# Altium integrated library Altium_WE-RJ45_LAN (rev21a).IntLib: 96 symbols
Pins are listed as number, name and electrical type; pins without a type are passive.

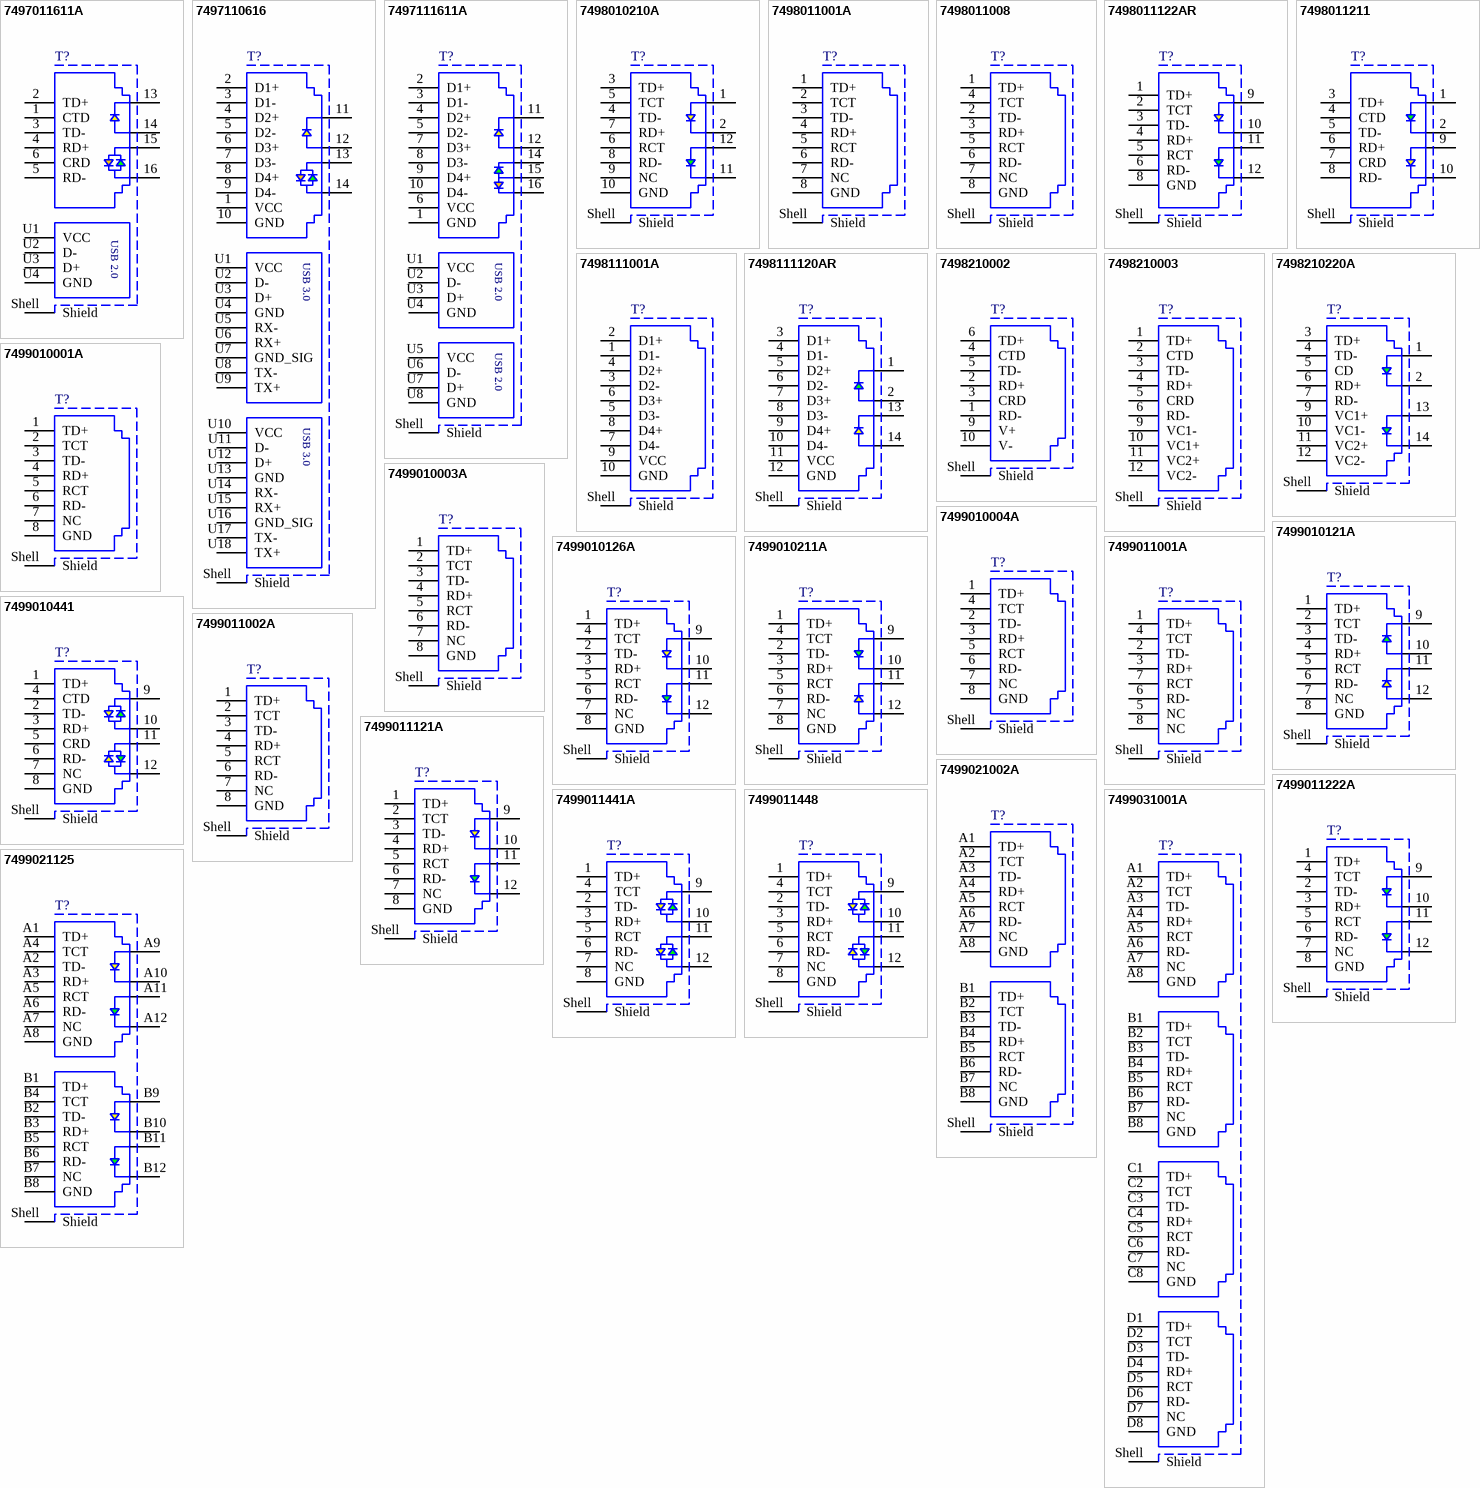
[diagram p0: symbols 7497011611A to 7499031001A]

## 7497011611A
designator T?
WE-RJ45 LAN Transformer, THT, 10/100 Base-T, Port 1x1, Tab Up; Manufacturer Part Number: 7497011611A; Manufacturer: Wurth Elektronik; PoE: non-PoE; LED: green/orange-yellow; USB: USB 2.0; Shield Tabs: Yes; HPLE: No; ComponentLink1Description: Manufacturer; ComponentLink1URL: http://www.we-online.de; ComponentLink2Description: Datasheet; ComponentLink2URL: https://www.we-online.com/catalog/datasheet/7497011611A.pdf; Published Date: October 2020; Tab: Up; Port Number: 1x1; Data Rate: 10/100 Base-T; Operating Temperature: -40 to +85degC; Mounting Technology: THT; Packaging: Tape and Reel
footprint 7497011611A
pins: 1 CTD, 2 TD+, 3 TD-, 4 RD+, 5 RD-, 6 CRD, 13, 14, 15, 16, Shell Shield, U1 VCC, U2 D-, U3 D+, U4 GND

## 7497110616
designator T?
WE-RJ45 LAN Transformer, THT, 10/100/1000 Base-T, Port 1x1, Tab Up; Manufacturer Part Number: 7497110616; Manufacturer: Wurth Elektronik; PoE: non-PoE; LED: yellow-green/orange; USB: 2xUSB 3.0; Shield Tabs: No; ComponentLink1Description: Manufacturer; ComponentLink1URL: http://www.we-online.de; ComponentLink2Description: Datasheet; ComponentLink2URL: https://www.we-online.com/catalog/datasheet/7497110616.pdf; Published Date: October 2020; Tab: Up; Port Number: 1x1; Data Rate: 10/100/1000 Base-T; Operating Temperature: -40 to +85degC; Mounting Technology: THT; Packaging: Tray; HPLE: No
footprint 7497110616
pins: 1 VCC, 2 D1+, 3 D1-, 4 D2+, 5 D2-, 6 D3+, 7 D3-, 8 D4+, 9 D4-, 10 GND, 11, 12, 13, 14, Shell Shield, U1 VCC, U2 D-, U3 D+, U4 GND, U5 RX-, U6 RX+, U7 GND_SIG, U8 TX-, U9 TX+, U10 VCC, U11 D-, U12 D+, U13 GND, U14 RX-, U15 RX+, U16 GND_SIG, U17 TX-, U18 TX+
text: USB 3.0

## 7497111611A
designator T?
WE-RJ45 LAN Transformer, THT, 10/100/1000 Base-T, Port 1x1, Tab Up; Manufacturer Part Number: 7497111611A; Manufacturer: Wurth Elektronik; PoE: non-PoE; LED: green/orange-yellow; USB: USB 2.0; Shield Tabs: Yes; HPLE: No; ComponentLink1Description: Manufacturer; ComponentLink1URL: http://www.we-online.de; ComponentLink2Description: Datasheet; ComponentLink2URL: https://www.we-online.com/catalog/datasheet/7497111611A.pdf; Published Date: October 2020; Tab: Up; Port Number: 1x1; Data Rate: 10/100/1000 Base-T; Operating Temperature: 0 to +70degC; Mounting Technology: THT; Packaging: Tube
footprint 7497111611A
pins: 1 GND, 2 D1+, 3 D1-, 4 D2+, 5 D2-, 6 VCC, 7 D3+, 8 D3-, 9 D4+, 10 D4-, 11, 12, 14, 15, 16, Shell Shield, U1 VCC, U2 D-, U3 D+, U4 GND, U5 VCC, U6 D-, U7 D+, U8 GND

## 7498010210A
designator T?
WE-RJ45 LAN Transformer, SMT, 10/100 Base-T, Port 1x1, Tab Up; Manufacturer Part Number: 7498010210A; Manufacturer: Wurth Elektronik; PoE: non-PoE; LED: green-yellow; USB: No; Shield Tabs: Yes; ComponentLink1Description: Manufacturer; ComponentLink1URL: http://www.we-online.de; ComponentLink2Description: Datasheet; ComponentLink2URL: https://www.we-online.com/catalog/datasheet/7498010210A.pdf; Published Date: October 2020; Tab: Up; Port Number: 1x1; Data Rate: 10/100 Base-T; Operating Temperature: -40 to +85degC; Mounting Technology: SMT; Packaging: Tape and Reel; HPLE: No
footprint 7498010210A (LAN Transformer, body 16.1x25.4mm)
pins: 1, 2, 3 TD+, 4 TD-, 5 TCT, 6 RCT, 7 RD+, 8 RD-, 9 NC, 10 GND, 11, 12, Shell Shield

## 7498011001A
designator T?
WE-RJ45 LAN Transformer, SMT, 10/100 Base-T, Port 1x1, Tab Down; Manufacturer Part Number: 7498011001A; Manufacturer: Wurth Elektronik; PoE: non-PoE; LED: No; Shield Tabs: Yes; ComponentLink1Description: Manufacturer; ComponentLink1URL: http://www.we-online.de; ComponentLink2Description: Datasheet; ComponentLink2URL: https://www.we-online.com/catalog/datasheet/7498011001A.pdf; Published Date: October 2020; Tab: Down; Port Number: 1x1; Data Rate: 10/100 Base-T; Operating Temperature: 0 to +70degC; USB: No; Mounting Technology: SMT; Packaging: Tray; HPLE: No
footprint 7498011001A
pins: 1 TD+, 2 TCT, 3 TD-, 4 RD+, 5 RCT, 6 RD-, 7 NC, 8 GND, Shell Shield

## 7498011008
designator T?
WE-RJ45 LAN Transformer, SMT, 10/100 Base-T, Port 1x1, Tab Down; Manufacturer Part Number: 7498011008; Manufacturer: Wurth Elektronik; PoE: non-PoE; LED: No; Shield Tabs: Yes; ComponentLink1Description: Manufacturer; ComponentLink1URL: http://www.we-online.de; ComponentLink2Description: Datasheet; ComponentLink2URL: https://www.we-online.com/catalog/datasheet/7498011008.pdf; Published Date: October 2020; Tab: Down; Port Number: 1x1; Data Rate: 10/100 Base-T; Operating Temperature: -40 to +85degC; USB: No; Mounting Technology: SMT; Packaging: Tray; HPLE: No
footprint 7498011008
pins: 1 TD+, 2 TD-, 3 RD+, 4 TCT, 5 RCT, 6 RD-, 7 NC, 8 GND, Shell Shield

## 7498011122AR
designator T?
WE-RJ45 LAN Transformer, SMT, 10/100 Base-T, Port 1x1, Tab Up; Manufacturer Part Number: 7498011122AR; Manufacturer: Wurth Elektronik; PoE: non-PoE; LED: yellow-green; USB: No; Shield Tabs: Yes; ComponentLink1Description: Manufacturer; ComponentLink1URL: http://www.we-online.de; ComponentLink2Description: Datasheet; ComponentLink2URL: https://www.we-online.com/catalog/datasheet/7498011122AR.pdf; Published Date: October 2020; Tab: Up; Port Number: 1x1; Data Rate: 10/100 Base-T; Operating Temperature: -40 to +85degC; Mounting Technology: SMT; Packaging: Tape and Reel; HPLE: No
footprint 7498011122AR
pins: 1 TD+, 2 TCT, 3 TD-, 4 RD+, 5 RCT, 6 RD-, 8 GND, 9, 10, 11, 12, Shell Shield

## 7498011211
designator T?
WE-RJ45 LAN Transformer, SMT, 10/100 Base-T, Port 1x1, Tab Down; Manufacturer Part Number: 7498011211; Manufacturer: Wurth Elektronik; PoE: non-PoE; LED: green-yellow; USB: No; Shield Tabs: Yes; ComponentLink1Description: Manufacturer; ComponentLink1URL: http://www.we-online.de; ComponentLink2Description: Datasheet; ComponentLink2URL: https://www.we-online.com/catalog/datasheet/7498011211.pdf; Published Date: October 2020; Tab: Down; Port Number: 1x1; Data Rate: 10/100 Base-T; Operating Temperature: 0 to +70degC; Mounting Technology: SMT; Packaging: Tray; HPLE: Yes
footprint 7498011211
pins: 1, 2, 3 TD+, 4 CTD, 5 TD-, 6 RD+, 7 CRD, 8 RD-, 9, 10, Shell Shield

## 7498111001A
designator T?
WE-RJ45 LAN Transformer, SMT, 10/100/1000 Base-T, Port 1x1, Tab Up; Manufacturer Part Number: 7498111001A; Manufacturer: Wurth Elektronik; PoE: non-PoE; LED: No; Shield Tabs: Yes; ComponentLink1Description: Manufacturer; ComponentLink1URL: http://www.we-online.de; ComponentLink2Description: Datasheet; ComponentLink2URL: https://www.we-online.com/catalog/datasheet/7498111001A.pdf; Published Date: October 2020; Tab: Up; Port Number: 1x1; Data Rate: 10/100/1000 Base-T; Operating Temperature: -40 to +85degC; USB: No; Mounting Technology: SMT; Packaging: Tray; HPLE: No
footprint 7498111001A
pins: 1 D1-, 2 D1+, 3 D2-, 4 D2+, 5 D3-, 6 D3+, 7 D4-, 8 D4+, 9 VCC, 10 GND, Shell Shield

## 7498111120AR
designator T?
WE-RJ45 LAN Transformer, SMT, 10/100/1000 Base-T, Port 1x1, Tab Up; Manufacturer Part Number: 7498111120AR; Manufacturer: Wurth Elektronik; PoE: non-PoE; LED: yellow-green; USB: No; Shield Tabs: Yes; ComponentLink1Description: Manufacturer; ComponentLink1URL: http://www.we-online.de; ComponentLink2Description: Datasheet; ComponentLink2URL: https://www.we-online.com/catalog/datasheet/7498111120AR.pdf; Published Date: October 2020; Tab: Up; Port Number: 1x1; Data Rate: 10/100/1000 Base-T; Operating Temperature: 0 to +70degC; Mounting Technology: SMT; Packaging: Tape and Reel; HPLE: No
footprint 7498111120AR
pins: 1, 2, 3 D1+, 4 D1-, 5 D2+, 6 D2-, 7 D3+, 8 D3-, 9 D4+, 10 D4-, 11 VCC, 12 GND, 13, 14, Shell Shield

## 7498210002
designator T?
WE-RJ45 LAN Transformer, SMT, 10/100 Base-T, Port 1x1, Tab Down; Manufacturer Part Number: 7498210002; Manufacturer: Wurth Elektronik; PoE: PoE (up to 350 mA); LED: No; ComponentLink1Description: Manufacturer; ComponentLink1URL: http://www.we-online.de; ComponentLink2Description: Datasheet; ComponentLink2URL: https://www.we-online.com/catalog/datasheet/7498210002.pdf; Published Date: October 2020; Tab: Down; Port Number: 1x1; Data Rate: 10/100 Base-T; Operating Temperature: -40 to +85degC; USB: No; Mounting Technology: SMT; Packaging: Tape and Reel; Shield Tabs: No; HPLE: No
footprint 7498210002
pins: 1 RD-, 2 RD+, 3 CRD, 4 CTD, 5 TD-, 6 TD+, 9 V+, 10 V-, Shell Shield

## 7498210003
designator T?
WE-RJ45 LAN Transformer, SMT, 10/100 Base-T, Port 1x1, Tab Up; Manufacturer Part Number: 7498210003; Manufacturer: Wurth Elektronik; PoE: PoE (up to 350 mA); LED: No; ComponentLink1Description: Manufacturer; ComponentLink1URL: http://www.we-online.de; ComponentLink2Description: Datasheet; ComponentLink2URL: https://www.we-online.com/catalog/datasheet/7498210003.pdf; Published Date: October 2020; Tab: Up; Port Number: 1x1; Data Rate: 10/100 Base-T; Operating Temperature: -40 to +85degC; USB: No; Mounting Technology: SMT; Packaging: Tray; Shield Tabs: No; HPLE: No
footprint 7498210003
pins: 1 TD+, 2 CTD, 3 TD-, 4 RD+, 5 CRD, 6 RD-, 9 VC1-, 10 VC1+, 11 VC2+, 12 VC2-, Shell Shield

## 7498210220A
designator T?
WE-RJ45 LAN Transformer, SMT, 10/100 Base-T, Port 1x1, Tab Up; Manufacturer Part Number: 7498210220A; Manufacturer: Wurth Elektronik; PoE: PoE (up to 350 mA); LED: green-green; USB: No; ComponentLink1Description: Manufacturer; ComponentLink1URL: http://www.we-online.de; ComponentLink2Description: Datasheet; ComponentLink2URL: https://www.we-online.com/catalog/datasheet/7498210220A.pdf; Published Date: October 2020; Tab: Up; Port Number: 1x1; Data Rate: 10/100 Base-T; Operating Temperature: -40 to +85degC; Mounting Technology: SMT; Packaging: Tray; Shield Tabs: No; HPLE: No
footprint 7498210220A
pins: 1, 2, 3 TD+, 4 TD-, 5 CD, 6 RD+, 7 RD-, 9 VC1+, 10 VC1-, 11 VC2+, 12 VC2-, 13, 14, Shell Shield

## 7499010001A
designator T?
WE-RJ45 LAN Transformer, THT, 10/100 Base-T, Port 1x1, Tab Up; Manufacturer Part Number: 7499010001A; Manufacturer: Wurth Elektronik; PoE: non-PoE; LED: No; ComponentLink1Description: Manufacturer; ComponentLink1URL: http://www.we-online.de; ComponentLink2Description: Datasheet; ComponentLink2URL: https://www.we-online.com/catalog/datasheet/7499010001A.pdf; Published Date: October 2020; Tab: Up; Port Number: 1x1; Data Rate: 10/100 Base-T; Operating Temperature: 0 to +70degC; USB: No; Mounting Technology: THT; Packaging: Tube; Shield Tabs: No; HPLE: No
footprint 7499010001A
pins: 1 TD+, 2 TCT, 3 TD-, 4 RD+, 5 RCT, 6 RD-, 7 NC, 8 GND, Shell Shield

## 7499010003A
designator T?
WE-RJ45 LAN Transformer, THT, 10/100 Base-T, Port 1x1, Tab Up; Manufacturer Part Number: 7499010003A; Manufacturer: Wurth Elektronik; PoE: non-PoE; LED: No; ComponentLink1Description: Manufacturer; ComponentLink1URL: http://www.we-online.de; ComponentLink2Description: Datasheet; ComponentLink2URL: https://www.we-online.com/catalog/datasheet/7499010003A.pdf; Published Date: October 2020; Tab: Up; Port Number: 1x1; Data Rate: 10/100 Base-T; Operating Temperature: -40 to +85degC; USB: No; Mounting Technology: THT; Packaging: Tube; Shield Tabs: No; HPLE: No
footprint 7499010003A
pins: 1 TD+, 2 TCT, 3 TD-, 4 RD+, 5 RCT, 6 RD-, 7 NC, 8 GND, Shell Shield

## 7499010004A
designator T?
WE-RJ45 LAN Transformer, THT, 10/100 Base-T, Port 1x1, Tab Down; Manufacturer Part Number: 7499010004A; Manufacturer: Wurth Elektronik; PoE: non-PoE; LED: No; ComponentLink1Description: Manufacturer; ComponentLink1URL: http://www.we-online.de; ComponentLink2Description: Datasheet; ComponentLink2URL: https://www.we-online.com/catalog/datasheet/7499010004A.pdf; Published Date: October 2020; Tab: Down; Port Number: 1x1; Data Rate: 10/100 Base-T; Operating Temperature: 0 to +70degC; USB: No; Mounting Technology: THT; Packaging: Tube; Shield Tabs: No; HPLE: No
footprint 7499010004A
pins: 1 TD+, 2 TD-, 3 RD+, 4 TCT, 5 RCT, 6 RD-, 7 NC, 8 GND, Shell Shield

## 7499010121A
designator T?
WE-RJ45 LAN Transformer, THT, 10/100 Base-T, Port 1x1, Tab Up; Manufacturer Part Number: 7499010121A; Manufacturer: Wurth Elektronik; PoE: non-PoE; LED: yellow-green; USB: No; ComponentLink1Description: Manufacturer; ComponentLink1URL: http://www.we-online.de; ComponentLink2Description: Datasheet; ComponentLink2URL: https://www.we-online.com/catalog/datasheet/7499010121A.pdf; Published Date: October 2020; Tab: Up; Port Number: 1x1; Data Rate: 10/100 Base-T; Operating Temperature: 0 to +70degC; Mounting Technology: THT; Packaging: Tube; Shield Tabs: No; HPLE: No
footprint 7499010121A
pins: 1 TD+, 2 TCT, 3 TD-, 4 RD+, 5 RCT, 6 RD-, 7 NC, 8 GND, 9, 10, 11, 12, Shell Shield

## 7499010126A
designator T?
WE-RJ45 LAN Transformer, THT, 10/100 Base-T, Port 1x1, Tab Vertical; Manufacturer Part Number: 7499010126A; Manufacturer: Wurth Elektronik; PoE: non-PoE; LED: yellow-green; USB: No; ComponentLink1Description: Manufacturer; ComponentLink1URL: http://www.we-online.de; ComponentLink2Description: Datasheet; ComponentLink2URL: https://www.we-online.com/catalog/datasheet/7499010126A.pdf; Published Date: October 2020; Tab: Vertical; Port Number: 1x1; Data Rate: 10/100 Base-T; Operating Temperature: -40 to +85degC; Mounting Technology: THT; Packaging: Tray; Shield Tabs: No; HPLE: No
footprint 7499010126A
pins: 1 TD+, 2 TD-, 3 RD+, 4 TCT, 5 RCT, 6 RD-, 7 NC, 8 GND, 9, 10, 11, 12, Shell Shield

## 7499010211A
designator T?
WE-RJ45 LAN Transformer, THT, 10/100 Base-T, Port 1x1, Tab Down; Manufacturer Part Number: 7499010211A; Manufacturer: Wurth Elektronik; PoE: non-PoE; LED: green-yellow; USB: No; ComponentLink1Description: Manufacturer; ComponentLink1URL: http://www.we-online.de; ComponentLink2Description: Datasheet; ComponentLink2URL: https://www.we-online.com/catalog/datasheet/7499010211A.pdf; Published Date: October 2020; Tab: Down; Port Number: 1x1; Data Rate: 10/100 Base-T; Operating Temperature: 0 to +70degC; Mounting Technology: THT; Packaging: Tube; Shield Tabs: No; HPLE: No
footprint 7499010211A
pins: 1 TD+, 2 TD-, 3 RD+, 4 TCT, 5 RCT, 6 RD-, 7 NC, 8 GND, 9, 10, 11, 12, Shell Shield

## 7499010441
designator T?
WE-RJ45 LAN Transformer, THT, 10/100 Base-T, Port 1x1, Tab Down; Manufacturer Part Number: 7499010441; Manufacturer: Wurth Elektronik; PoE: non-PoE; LED: green/yellow-green/yellow; USB: No; ComponentLink1Description: Manufacturer; ComponentLink1URL: http://www.we-online.de; ComponentLink2Description: Datasheet; ComponentLink2URL: https://www.we-online.com/catalog/datasheet/7499010441.pdf; Published Date: October 2020; Tab: Down; Port Number: 1x1; Data Rate: 10/100 Base-T; Operating Temperature: -40 to +85degC; Mounting Technology: THT; Packaging: Tube; Shield Tabs: No; HPLE: No
footprint 7499010441
pins: 1 TD+, 2 TD-, 3 RD+, 4 CTD, 5 CRD, 6 RD-, 7 NC, 8 GND, 9, 10, 11, 12, Shell Shield

## 7499011001A
designator T?
WE-RJ45 LAN Transformer, THT, 10/100 Base-T, Port 1x1, Tab Down; Manufacturer Part Number: 7499011001A; Manufacturer: Wurth Elektronik; PoE: non-PoE; LED: No; Shield Tabs: Yes; ComponentLink1Description: Manufacturer; ComponentLink1URL: http://www.we-online.de; ComponentLink2Description: Datasheet; ComponentLink2URL: https://www.we-online.com/catalog/datasheet/7499011001A.pdf; Published Date: October 2020; Tab: Down; Port Number: 1x1; Data Rate: 10/100 Base-T; Operating Temperature: -40 to +85degC; USB: No; Mounting Technology: THT; Packaging: Tube; HPLE: No
footprint 7499011001A
pins: 1 TD+, 2 TD-, 3 RD+, 4 TCT, 5 NC, 6 RD-, 7 RCT, 8 NC, Shell Shield

## 7499011002A
designator T?
WE-RJ45 LAN Transformer, THT, 10/100 Base-T, Port 1x1, Tab Down; Manufacturer Part Number: 7499011002A; Manufacturer: Wurth Elektronik; PoE: non-PoE; LED: No; Shield Tabs: Yes; ComponentLink1Description: Manufacturer; ComponentLink1URL: http://www.we-online.de; ComponentLink2Description: Datasheet; ComponentLink2URL: https://www.we-online.com/catalog/datasheet/7499011002A.pdf; Published Date: October 2020; Tab: Down; Port Number: 1x1; Data Rate: 10/100 Base-T; Operating Temperature: 0 to +70degC; USB: No; Mounting Technology: THT; Packaging: Tube; HPLE: No
footprint 7499011002A
pins: 1 TD+, 2 TCT, 3 TD-, 4 RD+, 5 RCT, 6 RD-, 7 NC, 8 GND, Shell Shield

## 7499011121A
designator T?
WE-RJ45 LAN Transformer, THT, 10/100 Base-T, Port 1x1, Tab Down; Manufacturer Part Number: 7499011121A; Manufacturer: Wurth Elektronik; PoE: non-PoE; LED: yellow-green; USB: No; Shield Tabs: Yes; ComponentLink1Description: Manufacturer; ComponentLink1URL: http://www.we-online.de; ComponentLink2Description: Datasheet; ComponentLink2URL: https://www.we-online.com/catalog/datasheet/7499011121A.pdf; Published Date: October 2020; Tab: Down; Port Number: 1x1; Data Rate: 10/100 Base-T; Operating Temperature: -40 to +85degC; Mounting Technology: THT; Packaging: Tube; HPLE: No
footprint 7499011121A
pins: 1 TD+, 2 TCT, 3 TD-, 4 RD+, 5 RCT, 6 RD-, 7 NC, 8 GND, 9, 10, 11, 12, Shell Shield

## 7499011222A
designator T?
WE-RJ45 LAN Transformer, THT, 10/100 Base-T, Port 1x1, Tab Down; Manufacturer Part Number: 7499011222A; Manufacturer: Wurth Elektronik; PoE: non-PoE; LED: green-green; USB: No; Shield Tabs: Yes; ComponentLink1Description: Manufacturer; ComponentLink1URL: http://www.we-online.de; ComponentLink2Description: Datasheet; ComponentLink2URL: https://www.we-online.com/catalog/datasheet/7499011222A.pdf; Published Date: October 2020; Tab: Down; Port Number: 1x1; Data Rate: 10/100 Base-T; Operating Temperature: -40 to +85degC; Mounting Technology: THT; Packaging: Tube; HPLE: No
footprint 7499011222A
pins: 1 TD+, 2 TD-, 3 RD+, 4 TCT, 5 RCT, 6 RD-, 7 NC, 8 GND, 9, 10, 11, 12, Shell Shield

## 7499011441A
designator T?
WE-RJ45 LAN Transformer, THT, 10/100 Base-T, Port 1x1, Tab Up; Manufacturer Part Number: 7499011441A; Manufacturer: Wurth Elektronik; PoE: non-PoE; LED: yellow/green-yellow/green; USB: No; Shield Tabs: Yes; ComponentLink1Description: Manufacturer; ComponentLink1URL: http://www.we-online.de; ComponentLink2Description: Datasheet; ComponentLink2URL: https://www.we-online.com/catalog/datasheet/7499011441A.pdf; Published Date: October 2020; Tab: Up; Port Number: 1x1; Data Rate: 10/100 Base-T; Operating Temperature: -40 to +85degC; Mounting Technology: THT; Packaging: Tube; HPLE: No
footprint 7499011441A
pins: 1 TD+, 2 TD-, 3 RD+, 4 TCT, 5 RCT, 6 RD-, 7 NC, 8 GND, 9, 10, 11, 12, Shell Shield

## 7499011448
designator T?
WE-RJ45 LAN Transformer, THT, 10/100 Base-T, Port 1, Tab Vertical; Manufacturer Part Number: 7499011448; Manufacturer: Wurth Elektronik; Port Number: 1; PoE: non-PoE; LED: yellow/green-yellow/green; USB: No; Shield Tabs: Yes; ComponentLink1Description: Manufacturer; ComponentLink1URL: http://www.we-online.de; ComponentLink2Description: Datasheet; ComponentLink2URL: https://www.we-online.com/catalog/datasheet/7499011448.pdf; Published Date: October 2020; Tab: Vertical; Data Rate: 10/100 Base-T; Operating Temperature: -40 to +85degC; Mounting Technology: THT; Packaging: Tray; HPLE: No
footprint 7499011448
pins: 1 TD+, 2 TD-, 3 RD+, 4 TCT, 5 RCT, 6 RD-, 7 NC, 8 GND, 9, 10, 11, 12, Shell Shield

## 7499021002A
designator T?
WE-RJ45 LAN Transformer, THT, 10/100 Base-T, Port 1x2, Tab Down; Manufacturer Part Number: 7499021002A; Manufacturer: Wurth Elektronik; PoE: non-PoE; LED: No; Shield Tabs: Yes; ComponentLink1Description: Manufacturer; ComponentLink1URL: http://www.we-online.de; ComponentLink2Description: Datasheet; ComponentLink2URL: https://www.we-online.com/catalog/datasheet/7499021002A.pdf; Published Date: October 2020; Tab: Down; Port Number: 1x2; Data Rate: 10/100 Base-T; Operating Temperature: -40 to +85degC; USB: No; Mounting Technology: THT; Packaging: Tray; HPLE: No
footprint 7499021002A
pins: A1 TD+, A2 TCT, A3 TD-, A4 RD+, A5 RCT, A6 RD-, A7 NC, A8 GND, B1 TD+, B2 TCT, B3 TD-, B4 RD+, B5 RCT, B6 RD-, B7 NC, B8 GND, Shell Shield

## 7499021125
designator T?
WE-RJ45 LAN Transformer, THT, 10/100 Base-T, Port 1x2, Tab Down; Manufacturer Part Number: 7499021125; Manufacturer: Wurth Elektronik; PoE: non-PoE; LED: yellow-green; USB: No; Shield Tabs: Yes; ComponentLink1Description: Manufacturer; ComponentLink1URL: http://www.we-online.de; ComponentLink2Description: Datasheet; ComponentLink2URL: https://www.we-online.com/catalog/datasheet/7499021125.pdf; Published Date: October 2020; Tab: Down; Port Number: 1x2; Data Rate: 10/100 Base-T; Operating Temperature: 0 to +70degC; Mounting Technology: THT; Packaging: Tube; HPLE: No
footprint 7499021125
pins: A1 TD+, A2 TD-, A3 RD+, A4 TCT, A5 RCT, A6 RD-, A7 NC, A8 GND, A9, A10, A11, A12, B1 TD+, B2 TD-, B3 RD+, B4 TCT, B5 RCT, B6 RD-, B7 NC, B8 GND, B9, B10, B11, B12, Shell Shield

## 7499031001A
designator T?
WE-RJ45 LAN Transformer, THT, 10/100 Base-T, Port 1x4, Tab Down; Manufacturer Part Number: 7499031001A; Manufacturer: Wurth Elektronik; PoE: non-PoE; LED: No; Shield Tabs: Yes; ComponentLink1Description: Manufacturer; ComponentLink1URL: http://www.we-online.de; ComponentLink2Description: Datasheet; ComponentLink2URL: https://www.we-online.com/catalog/datasheet/7499031001A.pdf; Published Date: October 2020; Tab: Down; Port Number: 1x4; Data Rate: 10/100 Base-T; Operating Temperature: -40 to +85degC; USB: No; Mounting Technology: THT; Packaging: Tube; HPLE: No
footprint 7499031001A
pins: A1 TD+, A2 TCT, A3 TD-, A4 RD+, A5 RCT, A6 RD-, A7 NC, A8 GND, B1 TD+, B2 TCT, B3 TD-, B4 RD+, B5 RCT, B6 RD-, B7 NC, B8 GND, C1 TD+, C2 TCT, C3 TD-, C4 RD+, C5 RCT, C6 RD-, C7 NC, C8 GND, D1 TD+, D2 TCT, D3 TD-, D4 RD+, D5 RCT, D6 RD-, D7 NC, D8 GND, Shell Shield

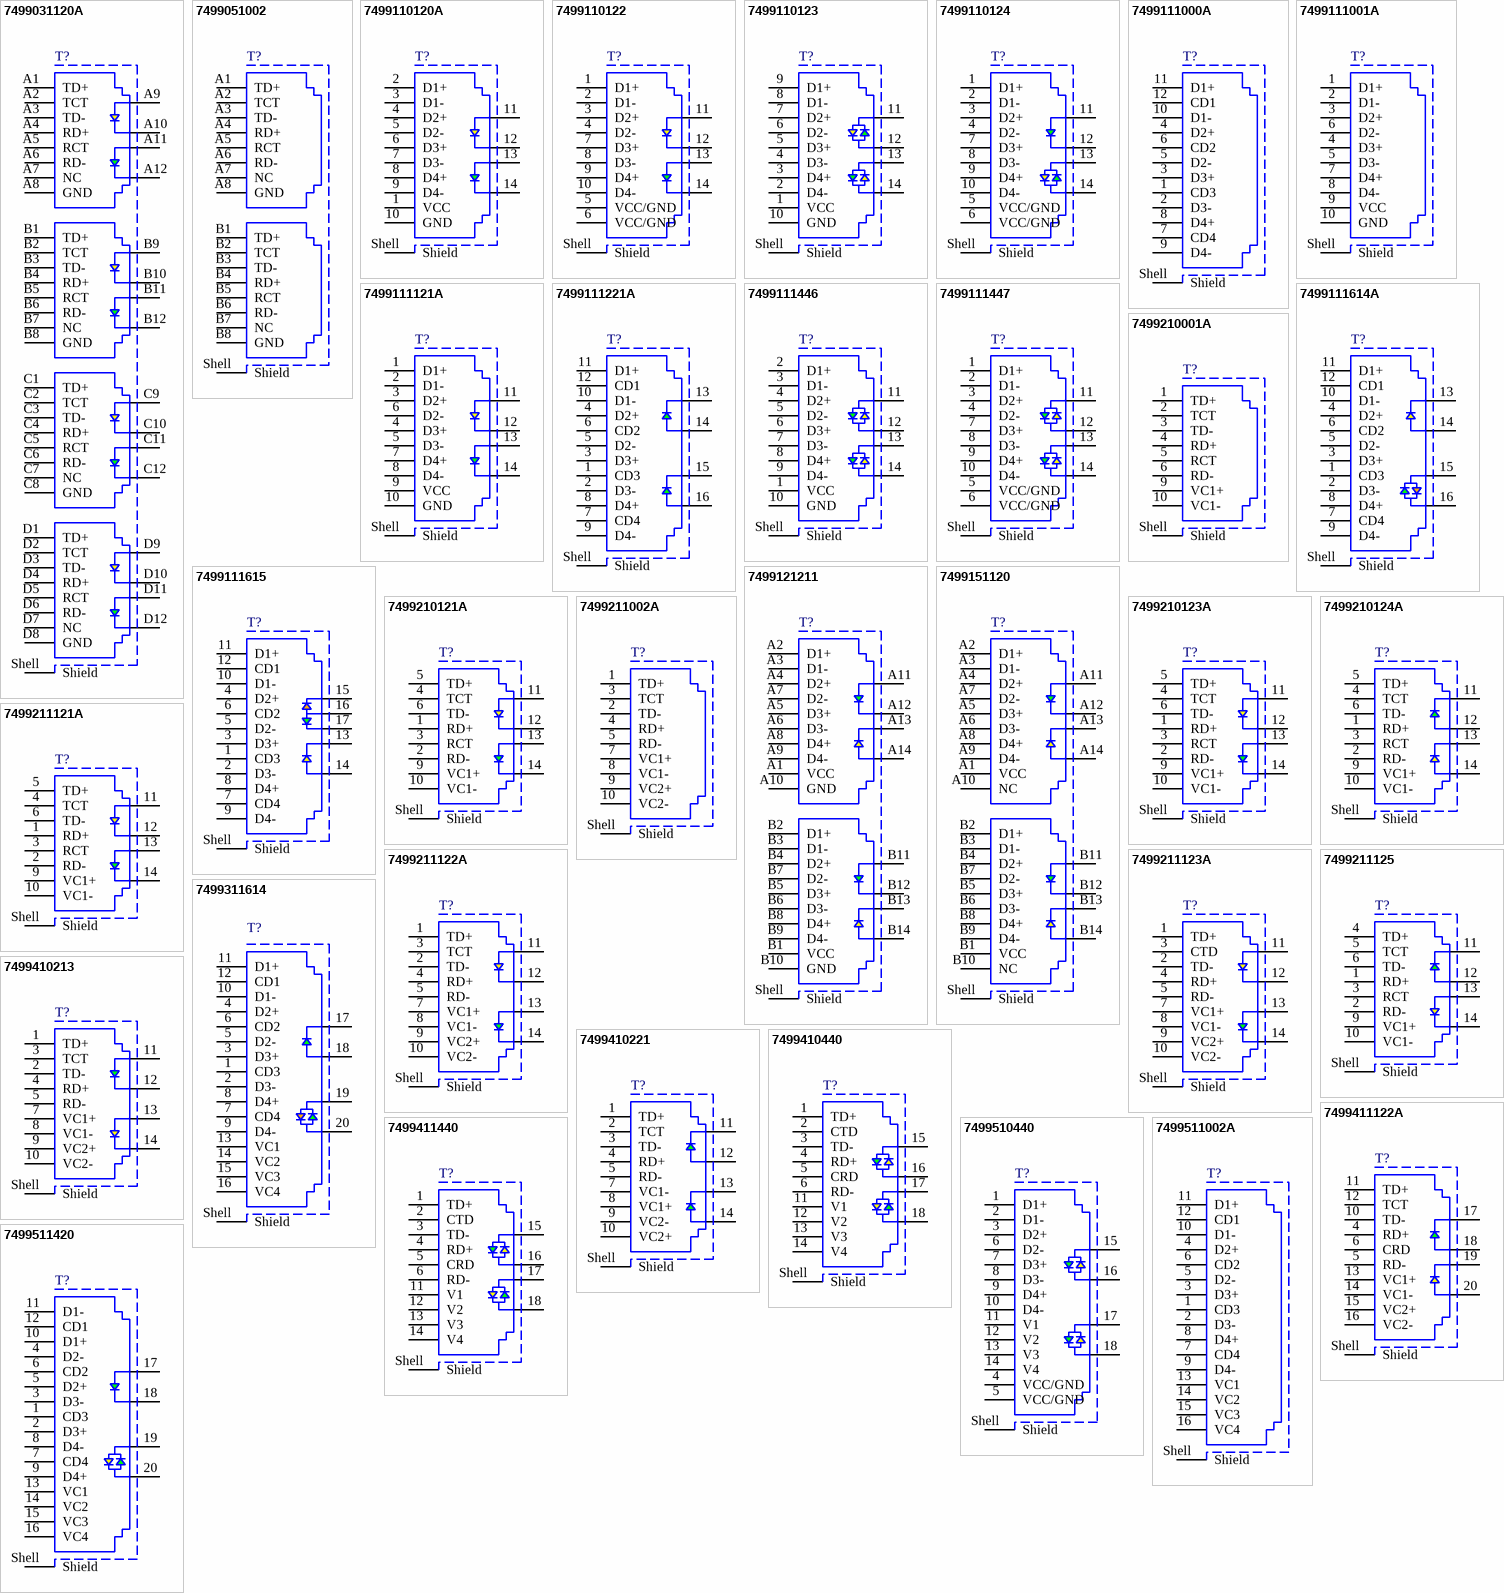
[diagram p1: symbols 7499031120A to 7499511420]

## 7499031120A
designator T?
WE-RJ45 LAN Transformer, THT, 10/100 Base-T, Port 1x4, Tab Down; Manufacturer Part Number: 7499031120A; Manufacturer: Wurth Elektronik; PoE: non-PoE; LED: yellow-green; USB: No; Shield Tabs: Yes; ComponentLink1Description: Manufacturer; ComponentLink1URL: http://www.we-online.de; ComponentLink2Description: Datasheet; ComponentLink2URL: https://www.we-online.com/catalog/datasheet/7499031120A.pdf; Published Date: October 2020; Tab: Down; Port Number: 1x4; Data Rate: 10/100 Base-T; Operating Temperature: -40 to +85degC; Mounting Technology: THT; Packaging: Tube; HPLE: No
footprint 7499031120A
pins: A1 TD+, A2 TCT, A3 TD-, A4 RD+, A5 RCT, A6 RD-, A7 NC, A8 GND, A9, A10, A11, A12, B1 TD+, B2 TCT, B3 TD-, B4 RD+, B5 RCT, B6 RD-, B7 NC, B8 GND, B9, B10, B11, B12, C1 TD+, C2 TCT, C3 TD-, C4 RD+, C5 RCT, C6 RD-, C7 NC, C8 GND, C9, C10, C11, C12, D1 TD+, D2 TCT, D3 TD-, D4 RD+, D5 RCT, D6 RD-, D7 NC, D8 GND, D9, D10, D11, D12, Shell Shield

## 7499051002
designator T?
WE-RJ45 LAN Transformer, THT, 10/100 Base-T, Port 2x1, Tab Up/Down; Manufacturer Part Number: 7499051002; Manufacturer: Wurth Elektronik; PoE: non-PoE; LED: No; Shield Tabs: Yes; ComponentLink1Description: Manufacturer; ComponentLink1URL: http://www.we-online.de; ComponentLink2Description: Datasheet; ComponentLink2URL: https://www.we-online.com/catalog/datasheet/7499051002.pdf; Published Date: October 2020; Tab: Up/Down; Port Number: 2x1; Data Rate: 10/100 Base-T; Operating Temperature: -40 to +85degC; USB: No; Mounting Technology: THT; Packaging: Tube; HPLE: No
footprint 7499051002
pins: A1 TD+, A2 TCT, A3 TD-, A4 RD+, A5 RCT, A6 RD-, A7 NC, A8 GND, B1 TD+, B2 TCT, B3 TD-, B4 RD+, B5 RCT, B6 RD-, B7 NC, B8 GND, Shell Shield

## 7499110120A
designator T?
WE-RJ45 LAN Transformer, THT, 10/100/1000 Base-T, Port 1x1, Tab Vertical; Manufacturer Part Number: 7499110120A; Manufacturer: Wurth Elektronik; PoE: non-PoE; LED: yellow-green; USB: No; ComponentLink1Description: Manufacturer; ComponentLink1URL: http://www.we-online.de; ComponentLink2Description: Datasheet; ComponentLink2URL: https://www.we-online.com/catalog/datasheet/7499110120A.pdf; Published Date: October 2020; Tab: Vertical; Port Number: 1x1; Data Rate: 10/100/1000 Base-T; Operating Temperature: -40 to +85degC; Mounting Technology: THT; Packaging: Tray; Shield Tabs: No; HPLE: No
footprint 7499110120A
pins: 1 VCC, 2 D1+, 3 D1-, 4 D2+, 5 D2-, 6 D3+, 7 D3-, 8 D4+, 9 D4-, 10 GND, 11, 12, 13, 14, Shell Shield

## 7499110122
designator T?
WE-RJ45 LAN Transformer, THT, 10/100/1000 Base-T, Port 1x1, Tab Down; Manufacturer Part Number: 7499110122; Manufacturer: Wurth Elektronik; PoE: non-PoE; LED: green-yellow; USB: No; ComponentLink1Description: Manufacturer; ComponentLink1URL: http://www.we-online.de; ComponentLink2Description: Datasheet; ComponentLink2URL: https://www.we-online.com/catalog/datasheet/7499110122.pdf; Published Date: October 2020; Tab: Down; Port Number: 1x1; Data Rate: 10/100/1000 Base-T; Operating Temperature: 0 to +70degC; Mounting Technology: THT; Packaging: Tube; Shield Tabs: No; HPLE: No
footprint 7499110122
pins: 1 D1+, 2 D1-, 3 D2+, 4 D2-, 5 VCC/GND, 6 VCC/GND, 7 D3+, 8 D3-, 9 D4+, 10 D4-, 11, 12, 13, 14, Shell Shield

## 7499110123
designator T?
WE-RJ45 LAN Transformer, THT, 10/100/1000 Base-T, Port 1x1, Tab Vertical; Manufacturer Part Number: 7499110123; Manufacturer: Wurth Elektronik; PoE: non-PoE; LED: green-yellow; USB: No; ComponentLink1Description: Manufacturer; ComponentLink1URL: http://www.we-online.de; ComponentLink2Description: Datasheet; ComponentLink2URL: https://www.we-online.com/catalog/datasheet/7499110123.pdf; Published Date: October 2020; Tab: Vertical; Port Number: 1x1; Data Rate: 10/100/1000 Base-T; Operating Temperature: -40 to +85degC; Mounting Technology: THT; Packaging: Tube; Shield Tabs: No; HPLE: No
footprint 7499110123
pins: 1 VCC, 2 D4-, 3 D4+, 4 D3-, 5 D3+, 6 D2-, 7 D2+, 8 D1-, 9 D1+, 10 GND, 11, 12, 13, 14, Shell Shield

## 7499110124
designator T?
WE-RJ45 LAN Transformer, THT, 10/100/1000 Base-T, Port 1x1, Tab Up; Manufacturer Part Number: 7499110124; Manufacturer: Wurth Elektronik; PoE: non-PoE; LED: green-yellow/green; USB: No; ComponentLink1Description: Manufacturer; ComponentLink1URL: http://www.we-online.de; ComponentLink2Description: Datasheet; ComponentLink2URL: https://www.we-online.com/catalog/datasheet/7499110124.pdf; Published Date: October 2020; Tab: Up; Port Number: 1x1; Data Rate: 10/100/1000 Base-T; Operating Temperature: -40 to +85degC; Mounting Technology: THT; Packaging: Tube; Shield Tabs: No; HPLE: No
footprint 7499110124
pins: 1 D1+, 2 D1-, 3 D2+, 4 D2-, 5 VCC/GND, 6 VCC/GND, 7 D3+, 8 D3-, 9 D4+, 10 D4-, 11, 12, 13, 14, Shell Shield

## 7499111000A
designator T?
WE-RJ45 LAN Transformer, THT, 10/100/1000 Base-T, Port 1x1, Tab Up; Manufacturer Part Number: 7499111000A; Manufacturer: Wurth Elektronik; PoE: non-PoE; LED: No; Shield Tabs: Yes; ComponentLink1Description: Manufacturer; ComponentLink1URL: http://www.we-online.de; ComponentLink2Description: Datasheet; ComponentLink2URL: https://www.we-online.com/catalog/datasheet/7499111000A.pdf; Published Date: October 2020; Tab: Up; Port Number: 1x1; Data Rate: 10/100/1000 Base-T; Operating Temperature: 0 to +70degC; USB: No; Mounting Technology: THT; Packaging: Tube; HPLE: No
footprint 7499111000A
pins: 1 CD3, 2 D3-, 3 D3+, 4 D2+, 5 D2-, 6 CD2, 7 CD4, 8 D4+, 9 D4-, 10 D1-, 11 D1+, 12 CD1, Shell Shield

## 7499111001A
designator T?
WE-RJ45 LAN Transformer, THT, 10/100/1000 Base-T, Port 1x1, Tab Down; Manufacturer Part Number: 7499111001A; Manufacturer: Wurth Elektronik; PoE: non-PoE; LED: No; Shield Tabs: Yes; ComponentLink1Description: Manufacturer; ComponentLink1URL: http://www.we-online.de; ComponentLink2Description: Datasheet; ComponentLink2URL: https://www.we-online.com/catalog/datasheet/7499111001A.pdf; Published Date: November 2020; Tab: Down; Port Number: 1x1; Data Rate: 10/100/1000 Base-T; Operating Temperature: 0 to +70degC; USB: No; Mounting Technology: THT; Packaging: Tube; HPLE: No
footprint 7499111001A
pins: 1 D1+, 2 D1-, 3 D2+, 4 D3+, 5 D3-, 6 D2-, 7 D4+, 8 D4-, 9 VCC, 10 GND, Shell Shield

## 7499111121A
designator T?
WE-RJ45 LAN Transformer, THT, 10/100/1000 Base-T, Port 1x1, Tab Down; Manufacturer Part Number: 7499111121A; Manufacturer: Wurth Elektronik; PoE: non-PoE; LED: yellow-green; USB: No; Shield Tabs: Yes; ComponentLink1Description: Manufacturer; ComponentLink1URL: http://www.we-online.de; ComponentLink2Description: Datasheet; ComponentLink2URL: https://www.we-online.com/catalog/datasheet/7499111121A.pdf; Published Date: October 2020; Tab: Down; Port Number: 1x1; Data Rate: 10/100/1000 Base-T; Operating Temperature: -40 to +85degC; Mounting Technology: THT; Packaging: Tube; HPLE: No
footprint 7499111121A
pins: 1 D1+, 2 D1-, 3 D2+, 4 D3+, 5 D3-, 6 D2-, 7 D4+, 8 D4-, 9 VCC, 10 GND, 11, 12, 13, 14, Shell Shield

## 7499111221A
designator T?
WE-RJ45 LAN Transformer, THT, 10/100/1000 Base-T, Port 1x1, Tab Up; Manufacturer Part Number: 7499111221A; Manufacturer: Wurth Elektronik; PoE: non-PoE; LED: green-green; USB: No; Shield Tabs: Yes; ComponentLink1Description: Manufacturer; ComponentLink1URL: http://www.we-online.de; ComponentLink2Description: Datasheet; ComponentLink2URL: https://www.we-online.com/catalog/datasheet/7499111221A.pdf; Published Date: November 2020; Tab: Up; Port Number: 1x1; Data Rate: 10/100/1000 Base-T; Operating Temperature: 0 to +70degC; Mounting Technology: THT; Packaging: Tube; HPLE: No
footprint 7499111221A
pins: 1 CD3, 2 D3-, 3 D3+, 4 D2+, 5 D2-, 6 CD2, 7 CD4, 8 D4+, 9 D4-, 10 D1-, 11 D1+, 12 CD1, 13, 14, 15, 16, Shell Shield

## 7499111446
designator T?
WE-RJ45 LAN Transformer, THT, 10/100/1000 Base-T, Port 1x1, Tab Down; Manufacturer Part Number: 7499111446; Manufacturer: Wurth Elektronik; PoE: non-PoE; LED: green/yellow-green/yellow; USB: No; Shield Tabs: Yes; ComponentLink1Description: Manufacturer; ComponentLink1URL: http://www.we-online.de; ComponentLink2Description: Datasheet; ComponentLink2URL: https://www.we-online.com/catalog/datasheet/7499111446.pdf; Published Date: October 2020; Tab: Down; Port Number: 1x1; Data Rate: 10/100/1000 Base-T; Operating Temperature: -40 to +85degC; Mounting Technology: THT; Packaging: Tube; HPLE: No
footprint 7499111446
pins: 1 VCC, 2 D1+, 3 D1-, 4 D2+, 5 D2-, 6 D3+, 7 D3-, 8 D4+, 9 D4-, 10 GND, 11, 12, 13, 14, Shell Shield

## 7499111447
designator T?
WE-RJ45 LAN Transformer, THT, 10/100/1000 Base-T, Port 1x1, Tab Up; Manufacturer Part Number: 7499111447; Manufacturer: Wurth Elektronik; PoE: non-PoE; LED: green/yellow-green/yellow; USB: No; Shield Tabs: Yes; ComponentLink1Description: Manufacturer; ComponentLink1URL: http://www.we-online.de; ComponentLink2Description: Datasheet; ComponentLink2URL: https://www.we-online.com/catalog/datasheet/7499111447.pdf; Published Date: October 2020; Tab: Up; Port Number: 1x1; Data Rate: 10/100/1000 Base-T; Operating Temperature: -40 to +85degC; Mounting Technology: THT; Packaging: Tube; HPLE: No
footprint 7499111447
pins: 1 D1+, 2 D1-, 3 D2+, 4 D2-, 5 VCC/GND, 6 VCC/GND, 7 D3+, 8 D3-, 9 D4+, 10 D4-, 11, 12, 13, 14, Shell Shield

## 7499111614A
designator T?
WE-RJ45 LAN Transformer, THT, 10/100/1000 Base-T, Port 1x1, Tab Up; Manufacturer Part Number: 7499111614A; Manufacturer: Wurth Elektronik; PoE: non-PoE; LED: green/orange-yellow; USB: No; Shield Tabs: Yes; ComponentLink1Description: Manufacturer; ComponentLink1URL: http://www.we-online.de; ComponentLink2Description: Datasheet; ComponentLink2URL: https://www.we-online.com/catalog/datasheet/7499111614A.pdf; Published Date: October 2020; Tab: Up; Port Number: 1x1; Data Rate: 10/100/1000 Base-T; Operating Temperature: 0 to +70degC; Mounting Technology: THT; Packaging: Tube; HPLE: Yes
footprint 7499111614A
pins: 1 CD3, 2 D3-, 3 D3+, 4 D2+, 5 D2-, 6 CD2, 7 CD4, 8 D4+, 9 D4-, 10 D1-, 11 D1+, 12 CD1, 13, 14, 15, 16, Shell Shield

## 7499111615
designator T?
WE-RJ45 LAN Transformer, THT, 1000 Base-T, Port 1, Tab Up; Manufacturer Part Number: 7499111615; Manufacturer: Wurth Elektronik; Port Number: 1; PoE: non-PoE; LED: green/orange-yellow; USB: No; Shield Tabs: Yes; ComponentLink1Description: Manufacturer; ComponentLink1URL: http://www.we-online.de; ComponentLink2Description: Datasheet; ComponentLink2URL: https://www.we-online.com/catalog/datasheet/7499111615.pdf; Published Date: October 2020; Tab: Up; Data Rate: 1000 Base-T; Operating Temperature: -40 to +85degC; Mounting Technology: THT; Packaging: Tray; HPLE: No
footprint 7499111615
pins: 1 CD3, 2 D3-, 3 D3+, 4 D2+, 5 D2-, 6 CD2, 7 CD4, 8 D4+, 9 D4-, 10 D1-, 11 D1+, 12 CD1, 13, 14, 15, 16, 17, Shell Shield

## 7499121211
designator T?
WE-RJ45 LAN Transformer, THT, 10/100/1000 Base-T, Port 1x2, Tab Down; Manufacturer Part Number: 7499121211; Manufacturer: Wurth Elektronik; PoE: non-PoE; LED: green-yellow; USB: No; Shield Tabs: Yes; ComponentLink1Description: Manufacturer; ComponentLink1URL: http://www.we-online.de; ComponentLink2Description: Datasheet; ComponentLink2URL: https://www.we-online.com/catalog/datasheet/7499121211.pdf; Published Date: October 2020; Tab: Down; Port Number: 1x2; Data Rate: 10/100/1000 Base-T; Operating Temperature: -40 to +85degC; Mounting Technology: THT; Packaging: Tube; HPLE: No
footprint 7499121211
pins: A1 VCC, A2 D1+, A3 D1-, A4 D2+, A5 D3+, A6 D3-, A7 D2-, A8 D4+, A9 D4-, A10 GND, A11, A12, A13, A14, B1 VCC, B2 D1+, B3 D1-, B4 D2+, B5 D3+, B6 D3-, B7 D2-, B8 D4+, B9 D4-, B10 GND, B11, B12, B13, B14, Shell Shield
